# Altium schematic symbol library jlcpcb_2025_04_capacitors_extended_0805.schlib: 3281 symbols (part 13 of 18) (continued)
## FM21N681J251ECG
designator C?  Capacitance: 680pF  (hidden comment: *)
Capacitor, Ceramic (MLCC), 680pF, ±5%, 250V, C0G, ±5%, SMD 0805; Manufacturer: PSA(Prosperity Dielectrics); Manufacturer Part Number: FM21N681J251ECG; Package Size: 0805; JLCPCB Basic Part: No; JLCPCB Part Number: C2915701; Supplier 1: LCSC; Category: Capacitors - MLCC; Supplier Part Number 1: C2915701; Tolerance: ±5%; Voltage Rating: 250V; Temperature Coefficient: C0G; RoHS: Yes; ComponentLink1Description: Datasheet; ComponentLink1URL: https://wmsc.lcsc.com/wmsc/upload/file/pdf/v2/lcsc/2111172030_PSA-Prosperity-Dielectrics-FM21N681J251ECG_C2915701.pdf; ComponentLink2Description: JLCPCB Part URL; ComponentLink2URL: https://jlcpcb.com/partdetail/C2915701; ComponentLink3Description: LCSC Part URL; ComponentLink3URL: https://lcsc.com/product-detail/Multilayer-Ceramic-Capacitors-MLCC---SMD-SMT_PSAProsperity-Dielectrics-PSAProsperity-Dielectrics-FM21N681J251ECG_C2915701.html
footprint CAP-0805 (0805 (2012M) Capacitor)
pins: 1, 2

## FM21X101K251PXG
designator C?  Capacitance: 100pF  (hidden comment: *)
Capacitor, Ceramic (MLCC), 100pF, 250V, X7R, SMD 0805; Manufacturer: PSA(Prosperity Dielectrics); Manufacturer Part Number: FM21X101K251PXG; Package Size: 0805; JLCPCB Basic Part: No; JLCPCB Part Number: C2929108; Supplier 1: LCSC; Category: Capacitors - MLCC; Supplier Part Number 1: C2929108; Voltage Rating: 250V; Temperature Coefficient: X7R; RoHS: Yes; ComponentLink1Description: Datasheet; ComponentLink1URL: https://wmsc.lcsc.com/wmsc/upload/file/pdf/v2/lcsc/2201121400_PSA-Prosperity-Dielectrics-FM21X101K251PXG_C2929108.pdf; ComponentLink2Description: JLCPCB Part URL; ComponentLink2URL: https://jlcpcb.com/partdetail/C2929108; ComponentLink3Description: LCSC Part URL; ComponentLink3URL: https://lcsc.com/product-detail/Multilayer-Ceramic-Capacitors-MLCC---SMD-SMT_PSAProsperity-Dielectrics-PSAProsperity-Dielectrics-FM21X101K251PXG_C2929108.html
footprint CAP-0805 (0805 (2012M) Capacitor)
pins: 1, 2

## FM21X102K201PXG
designator C?  Capacitance: 1nF  (hidden comment: *)
Capacitor, Ceramic (MLCC), 1nF, ±10%, 200V, X7R, ±10%, SMD 0805; Manufacturer: PSA(Prosperity Dielectrics); Manufacturer Part Number: FM21X102K201PXG; Package Size: 0805; JLCPCB Basic Part: No; JLCPCB Part Number: C525179; Supplier 1: LCSC; Category: Capacitors - MLCC; Supplier Part Number 1: C525179; Tolerance: ±10%; Voltage Rating: 200V; Temperature Coefficient: X7R; RoHS: Yes; ComponentLink1Description: Datasheet; ComponentLink1URL: https://wmsc.lcsc.com/wmsc/upload/file/pdf/v2/lcsc/2304140030_PSA-Prosperity-Dielectrics-FM21X102K201PXG_C525179.pdf; ComponentLink2Description: JLCPCB Part URL; ComponentLink2URL: https://jlcpcb.com/partdetail/C525179; ComponentLink3Description: LCSC Part URL; ComponentLink3URL: https://lcsc.com/product-detail/Multilayer-Ceramic-Capacitors-MLCC---SMD-SMT_PSAProsperity-Dielectrics-PSAProsperity-Dielectrics-FM21X102K201PXG_C525179.html
footprint CAP-0805 (0805 (2012M) Capacitor)
pins: 1, 2

## FM21X102K501PXG
designator C?  Capacitance: 1nF  (hidden comment: *)
Capacitor, Ceramic (MLCC), 1nF, ±10%, 500V, X7R, ±10%, SMD 0805; Manufacturer: PSA(Prosperity Dielectrics); Manufacturer Part Number: FM21X102K501PXG; Package Size: 0805; JLCPCB Basic Part: No; JLCPCB Part Number: C440004; Supplier 1: LCSC; Category: Capacitors - MLCC; Supplier Part Number 1: C440004; Tolerance: ±10%; Voltage Rating: 500V; Temperature Coefficient: X7R; RoHS: Yes; ComponentLink1Description: Datasheet; ComponentLink1URL: https://wmsc.lcsc.com/wmsc/upload/file/pdf/v2/lcsc/2304140030_PSA-Prosperity-Dielectrics-FM21X102K501PXG_C440004.pdf; ComponentLink2Description: JLCPCB Part URL; ComponentLink2URL: https://jlcpcb.com/partdetail/C440004; ComponentLink3Description: LCSC Part URL; ComponentLink3URL: https://lcsc.com/product-detail/Multilayer-Ceramic-Capacitors-MLCC---SMD-SMT_PSAProsperity-Dielectrics-PSAProsperity-Dielectrics-FM21X102K501PXG_C440004.html
footprint CAP-0805 (0805 (2012M) Capacitor)
pins: 1, 2

## FM21X102K631PXG
designator C?  Capacitance: 1nF  (hidden comment: *)
Capacitor, Ceramic (MLCC), 1nF, ±10%, 630V, X7R, ±10%, SMD 0805; Manufacturer: PSA(Prosperity Dielectrics); Manufacturer Part Number: FM21X102K631PXG; Package Size: 0805; JLCPCB Basic Part: No; JLCPCB Part Number: C436243; Supplier 1: LCSC; Category: Capacitors - MLCC; Supplier Part Number 1: C436243; Tolerance: ±10%; Voltage Rating: 630V; Temperature Coefficient: X7R; RoHS: Yes; ComponentLink1Description: Datasheet; ComponentLink1URL: https://wmsc.lcsc.com/wmsc/upload/file/pdf/v2/lcsc/2304140030_PSA-Prosperity-Dielectrics-FM21X102K631PXG_C436243.pdf; ComponentLink2Description: JLCPCB Part URL; ComponentLink2URL: https://jlcpcb.com/partdetail/C436243; ComponentLink3Description: LCSC Part URL; ComponentLink3URL: https://lcsc.com/product-detail/Multilayer-Ceramic-Capacitors-MLCC---SMD-SMT_PSAProsperity-Dielectrics-PSAProsperity-Dielectrics-FM21X102K631PXG_C436243.html
footprint CAP-0805 (0805 (2012M) Capacitor)
pins: 1, 2

## FM21X103K101PXG
designator C?  Capacitance: 10nF  (hidden comment: *)
Capacitor, Ceramic (MLCC), 10nF, ±10%, 100V, X7R, ±10%, SMD 0805; Manufacturer: PSA(Prosperity Dielectrics); Manufacturer Part Number: FM21X103K101PXG; Package Size: 0805; JLCPCB Basic Part: No; JLCPCB Part Number: C525180; Supplier 1: LCSC; Category: Capacitors - MLCC; Supplier Part Number 1: C525180; Tolerance: ±10%; Voltage Rating: 100V; Temperature Coefficient: X7R; RoHS: Yes; ComponentLink1Description: Datasheet; ComponentLink1URL: https://wmsc.lcsc.com/wmsc/upload/file/pdf/v2/lcsc/2304140030_PSA-Prosperity-Dielectrics-FM21X103K101PXG_C525180.pdf; ComponentLink2Description: JLCPCB Part URL; ComponentLink2URL: https://jlcpcb.com/partdetail/C525180; ComponentLink3Description: LCSC Part URL; ComponentLink3URL: https://lcsc.com/product-detail/Multilayer-Ceramic-Capacitors-MLCC---SMD-SMT_PSAProsperity-Dielectrics-PSAProsperity-Dielectrics-FM21X103K101PXG_C525180.html
footprint CAP-0805 (0805 (2012M) Capacitor)
pins: 1, 2

## FM21X103K201ECG
designator C?  Capacitance: 10nF  (hidden comment: *)
Capacitor, Ceramic (MLCC), 10nF, ±10%, 200V, X7R, ±10%, SMD 0805; Manufacturer: PSA(Prosperity Dielectrics); Manufacturer Part Number: FM21X103K201ECG; Package Size: 0805; JLCPCB Basic Part: No; JLCPCB Part Number: C382245; Supplier 1: LCSC; Category: Capacitors - MLCC; Supplier Part Number 1: C382245; Tolerance: ±10%; Voltage Rating: 200V; Temperature Coefficient: X7R; RoHS: Yes; ComponentLink1Description: Datasheet; ComponentLink1URL: https://wmsc.lcsc.com/wmsc/upload/file/pdf/v2/lcsc/2304140030_PSA-Prosperity-Dielectrics-FM21X103K201ECG_C382245.pdf; ComponentLink2Description: JLCPCB Part URL; ComponentLink2URL: https://jlcpcb.com/partdetail/C382245; ComponentLink3Description: LCSC Part URL; ComponentLink3URL: https://lcsc.com/product-detail/Multilayer-Ceramic-Capacitors-MLCC---SMD-SMT_PSAProsperity-Dielectrics-PSAProsperity-Dielectrics-FM21X103K201ECG_C382245.html
footprint CAP-0805 (0805 (2012M) Capacitor)
pins: 1, 2

## FM21X103K251ECG
designator C?  Capacitance: 10nF  (hidden comment: *)
Capacitor, Ceramic (MLCC), 10nF, ±10%, 250V, X7R, ±10%, SMD 0805; Manufacturer: PSA(Prosperity Dielectrics); Manufacturer Part Number: FM21X103K251ECG; Package Size: 0805; JLCPCB Basic Part: No; JLCPCB Part Number: C394155; Supplier 1: LCSC; Category: Capacitors - MLCC; Supplier Part Number 1: C394155; Tolerance: ±10%; Voltage Rating: 250V; Temperature Coefficient: X7R; RoHS: Yes; ComponentLink1Description: Datasheet; ComponentLink1URL: https://wmsc.lcsc.com/wmsc/upload/file/pdf/v2/lcsc/2304140030_PSA-Prosperity-Dielectrics-FM21X103K251ECG_C394155.pdf; ComponentLink2Description: JLCPCB Part URL; ComponentLink2URL: https://jlcpcb.com/partdetail/C394155; ComponentLink3Description: LCSC Part URL; ComponentLink3URL: https://lcsc.com/product-detail/Multilayer-Ceramic-Capacitors-MLCC---SMD-SMT_PSAProsperity-Dielectrics-PSAProsperity-Dielectrics-FM21X103K251ECG_C394155.html
footprint CAP-0805 (0805 (2012M) Capacitor)
pins: 1, 2

## FM21X103K251PXG
designator C?  Capacitance: 10nF  (hidden comment: *)
Capacitor, Ceramic (MLCC), 10nF, ±10%, 250V, X7R, ±10%, SMD 0805; Manufacturer: PSA(Prosperity Dielectrics); Manufacturer Part Number: FM21X103K251PXG; Package Size: 0805; JLCPCB Basic Part: No; JLCPCB Part Number: C382244; Supplier 1: LCSC; Category: Capacitors - MLCC; Supplier Part Number 1: C382244; Tolerance: ±10%; Voltage Rating: 250V; Temperature Coefficient: X7R; RoHS: Yes; ComponentLink1Description: Datasheet; ComponentLink1URL: https://wmsc.lcsc.com/wmsc/upload/file/pdf/v2/lcsc/2304140030_PSA-Prosperity-Dielectrics-FM21X103K251PXG_C382244.pdf; ComponentLink2Description: JLCPCB Part URL; ComponentLink2URL: https://jlcpcb.com/partdetail/C382244; ComponentLink3Description: LCSC Part URL; ComponentLink3URL: https://lcsc.com/product-detail/Multilayer-Ceramic-Capacitors-MLCC---SMD-SMT_PSAProsperity-Dielectrics-PSAProsperity-Dielectrics-FM21X103K251PXG_C382244.html
footprint CAP-0805 (0805 (2012M) Capacitor)
pins: 1, 2

## FM21X103K501ECG
designator C?  Capacitance: 10nF  (hidden comment: *)
Capacitor, Ceramic (MLCC), 10nF, ±10%, 500V, X7R, ±10%, SMD 0805; Manufacturer: PSA(Prosperity Dielectrics); Manufacturer Part Number: FM21X103K501ECG; Package Size: 0805; JLCPCB Basic Part: No; JLCPCB Part Number: C382243; Supplier 1: LCSC; Category: Capacitors - MLCC; Supplier Part Number 1: C382243; Tolerance: ±10%; Voltage Rating: 500V; Temperature Coefficient: X7R; RoHS: Yes; ComponentLink1Description: Datasheet; ComponentLink1URL: https://wmsc.lcsc.com/wmsc/upload/file/pdf/v2/lcsc/2304140030_PSA-Prosperity-Dielectrics-FM21X103K501ECG_C382243.pdf; ComponentLink2Description: JLCPCB Part URL; ComponentLink2URL: https://jlcpcb.com/partdetail/C382243; ComponentLink3Description: LCSC Part URL; ComponentLink3URL: https://lcsc.com/product-detail/Multilayer-Ceramic-Capacitors-MLCC---SMD-SMT_PSAProsperity-Dielectrics-PSAProsperity-Dielectrics-FM21X103K501ECG_C382243.html
footprint CAP-0805 (0805 (2012M) Capacitor)
pins: 1, 2

## FM21X104J101ECG
designator C?  Capacitance: 100nF  (hidden comment: *)
Capacitor, Ceramic (MLCC), 100nF, ±5%, 100V, X7R, ±5%, SMD 0805; Manufacturer: PSA(Prosperity Dielectrics); Manufacturer Part Number: FM21X104J101ECG; Package Size: 0805; JLCPCB Basic Part: No; JLCPCB Part Number: C2874759; Supplier 1: LCSC; Category: Capacitors - MLCC; Supplier Part Number 1: C2874759; Tolerance: ±5%; Voltage Rating: 100V; Temperature Coefficient: X7R; RoHS: Yes; ComponentLink1Description: Datasheet; ComponentLink1URL: https://wmsc.lcsc.com/wmsc/upload/file/pdf/v2/lcsc/2108150330_PSA-Prosperity-Dielectrics-FM21X104J101ECG_C2874759.pdf; ComponentLink2Description: JLCPCB Part URL; ComponentLink2URL: https://jlcpcb.com/partdetail/C2874759; ComponentLink3Description: LCSC Part URL; ComponentLink3URL: https://lcsc.com/product-detail/Multilayer-Ceramic-Capacitors-MLCC---SMD-SMT_PSAProsperity-Dielectrics-PSAProsperity-Dielectrics-FM21X104J101ECG_C2874759.html
footprint CAP-0805 (0805 (2012M) Capacitor)
pins: 1, 2

## FM21X104K101ECG
designator C?  Capacitance: 100nF  (hidden comment: *)
Capacitor, Ceramic (MLCC), 100nF, ±10%, 100V, X7R, ±10%, SMD 0805; Manufacturer: PSA(Prosperity Dielectrics); Manufacturer Part Number: FM21X104K101ECG; Package Size: 0805; JLCPCB Basic Part: No; JLCPCB Part Number: C148241; Supplier 1: LCSC; Category: Capacitors - MLCC; Supplier Part Number 1: C148241; Tolerance: ±10%; Voltage Rating: 100V; Temperature Coefficient: X7R; RoHS: Yes; ComponentLink1Description: Datasheet; ComponentLink1URL: https://wmsc.lcsc.com/wmsc/upload/file/pdf/v2/lcsc/1811101032_PSA-Prosperity-Dielectrics-FM21X104K101ECG_C148241.pdf; ComponentLink2Description: JLCPCB Part URL; ComponentLink2URL: https://jlcpcb.com/partdetail/C148241; ComponentLink3Description: LCSC Part URL; ComponentLink3URL: https://lcsc.com/product-detail/Multilayer-Ceramic-Capacitors-MLCC---SMD-SMT_PSAProsperity-Dielectrics-PSAProsperity-Dielectrics-FM21X104K101ECG_C148241.html
footprint CAP-0805 (0805 (2012M) Capacitor)
pins: 1, 2

## FM21X104K201ECG
designator C?  Capacitance: 100nF  (hidden comment: *)
Capacitor, Ceramic (MLCC), 100nF, ±10%, 200V, X7R, ±10%, SMD 0805; Manufacturer: PSA(Prosperity Dielectrics); Manufacturer Part Number: FM21X104K201ECG; Package Size: 0805; JLCPCB Basic Part: No; JLCPCB Part Number: C784084; Supplier 1: LCSC; Category: Capacitors - MLCC; Supplier Part Number 1: C784084; Tolerance: ±10%; Voltage Rating: 200V; Temperature Coefficient: X7R; RoHS: Yes; ComponentLink1Description: Datasheet; ComponentLink1URL: https://wmsc.lcsc.com/wmsc/upload/file/pdf/v2/lcsc/2304140030_PSA-Prosperity-Dielectrics-FM21X104K201ECG_C784084.pdf; ComponentLink2Description: JLCPCB Part URL; ComponentLink2URL: https://jlcpcb.com/partdetail/C784084; ComponentLink3Description: LCSC Part URL; ComponentLink3URL: https://lcsc.com/product-detail/Multilayer-Ceramic-Capacitors-MLCC---SMD-SMT_PSAProsperity-Dielectrics-PSAProsperity-Dielectrics-FM21X104K201ECG_C784084.html
footprint CAP-0805 (0805 (2012M) Capacitor)
pins: 1, 2

## FM21X122K101PXG
designator C?  Capacitance: 1.2nF  (hidden comment: *)
Capacitor, Ceramic (MLCC), 1.2nF, ±10%, 100V, X7R, ±10%, SMD 0805; Manufacturer: PSA(Prosperity Dielectrics); Manufacturer Part Number: FM21X122K101PXG; Package Size: 0805; JLCPCB Basic Part: No; JLCPCB Part Number: C565631; Supplier 1: LCSC; Category: Capacitors - MLCC; Supplier Part Number 1: C565631; Tolerance: ±10%; Voltage Rating: 100V; Temperature Coefficient: X7R; RoHS: Yes; ComponentLink1Description: Datasheet; ComponentLink1URL: https://wmsc.lcsc.com/wmsc/upload/file/pdf/v2/lcsc/2304140030_PSA-Prosperity-Dielectrics-FM21X122K101PXG_C565631.pdf; ComponentLink2Description: JLCPCB Part URL; ComponentLink2URL: https://jlcpcb.com/partdetail/C565631; ComponentLink3Description: LCSC Part URL; ComponentLink3URL: https://lcsc.com/product-detail/Multilayer-Ceramic-Capacitors-MLCC---SMD-SMT_PSAProsperity-Dielectrics-PSAProsperity-Dielectrics-FM21X122K101PXG_C565631.html
footprint CAP-0805 (0805 (2012M) Capacitor)
pins: 1, 2

## FM21X122K251PXG
designator C?  Capacitance: 1.2nF  (hidden comment: *)
Capacitor, Ceramic (MLCC), 1.2nF, ±10%, 250V, ±10%, SMD 0805; Manufacturer: PSA(Prosperity Dielectrics); Manufacturer Part Number: FM21X122K251PXG; Package Size: 0805; JLCPCB Basic Part: No; JLCPCB Part Number: C565652; Supplier 1: LCSC; Category: Capacitors - MLCC; Supplier Part Number 1: C565652; Tolerance: ±10%; Voltage Rating: 250V; RoHS: Yes; ComponentLink1Description: Datasheet; ComponentLink1URL: https://wmsc.lcsc.com/wmsc/upload/file/pdf/v2/lcsc/2304140030_PSA-Prosperity-Dielectrics-FM21X122K251PXG_C565652.pdf; ComponentLink2Description: JLCPCB Part URL; ComponentLink2URL: https://jlcpcb.com/partdetail/C565652; ComponentLink3Description: LCSC Part URL; ComponentLink3URL: https://lcsc.com/product-detail/Multilayer-Ceramic-Capacitors-MLCC---SMD-SMT_PSAProsperity-Dielectrics-PSAProsperity-Dielectrics-FM21X122K251PXG_C565652.html
footprint CAP-0805 (0805 (2012M) Capacitor)
pins: 1, 2

## FM21X152K101PXG
designator C?  Capacitance: 1.5nF  (hidden comment: *)
Capacitor, Ceramic (MLCC), 1.5nF, ±10%, 100V, X7R, ±10%, SMD 0805; Manufacturer: PSA(Prosperity Dielectrics); Manufacturer Part Number: FM21X152K101PXG; Package Size: 0805; JLCPCB Basic Part: No; JLCPCB Part Number: C565632; Supplier 1: LCSC; Category: Capacitors - MLCC; Supplier Part Number 1: C565632; Tolerance: ±10%; Voltage Rating: 100V; Temperature Coefficient: X7R; RoHS: Yes; ComponentLink1Description: Datasheet; ComponentLink1URL: https://wmsc.lcsc.com/wmsc/upload/file/pdf/v2/lcsc/2304140030_PSA-Prosperity-Dielectrics-FM21X152K101PXG_C565632.pdf; ComponentLink2Description: JLCPCB Part URL; ComponentLink2URL: https://jlcpcb.com/partdetail/C565632; ComponentLink3Description: LCSC Part URL; ComponentLink3URL: https://lcsc.com/product-detail/Multilayer-Ceramic-Capacitors-MLCC---SMD-SMT_PSAProsperity-Dielectrics-PSAProsperity-Dielectrics-FM21X152K101PXG_C565632.html
footprint CAP-0805 (0805 (2012M) Capacitor)
pins: 1, 2

## FM21X152K251PXG
designator C?  Capacitance: 1.5nF  (hidden comment: *)
Capacitor, Ceramic (MLCC), 1.5nF, ±10%, 250V, X7R, ±10%, SMD 0805; Manufacturer: PSA(Prosperity Dielectrics); Manufacturer Part Number: FM21X152K251PXG; Package Size: 0805; JLCPCB Basic Part: No; JLCPCB Part Number: C565653; Supplier 1: LCSC; Category: Capacitors - MLCC; Supplier Part Number 1: C565653; Tolerance: ±10%; Voltage Rating: 250V; Temperature Coefficient: X7R; RoHS: Yes; ComponentLink1Description: Datasheet; ComponentLink1URL: https://wmsc.lcsc.com/wmsc/upload/file/pdf/v2/lcsc/2304140030_PSA-Prosperity-Dielectrics-FM21X152K251PXG_C565653.pdf; ComponentLink2Description: JLCPCB Part URL; ComponentLink2URL: https://jlcpcb.com/partdetail/C565653; ComponentLink3Description: LCSC Part URL; ComponentLink3URL: https://lcsc.com/product-detail/Multilayer-Ceramic-Capacitors-MLCC---SMD-SMT_PSAProsperity-Dielectrics-PSAProsperity-Dielectrics-FM21X152K251PXG_C565653.html
footprint CAP-0805 (0805 (2012M) Capacitor)
pins: 1, 2

## FM21X182K251PXG
designator C?  Capacitance: 1.8nF  (hidden comment: *)
Capacitor, Ceramic (MLCC), 1.8nF, ±10%, 250V, ±10%, SMD 0805; Manufacturer: PSA(Prosperity Dielectrics); Manufacturer Part Number: FM21X182K251PXG; Package Size: 0805; JLCPCB Basic Part: No; JLCPCB Part Number: C565654; Supplier 1: LCSC; Category: Capacitors - MLCC; Supplier Part Number 1: C565654; Tolerance: ±10%; Voltage Rating: 250V; RoHS: Yes; ComponentLink1Description: Datasheet; ComponentLink1URL: https://wmsc.lcsc.com/wmsc/upload/file/pdf/v2/lcsc/2304140030_PSA-Prosperity-Dielectrics-FM21X182K251PXG_C565654.pdf; ComponentLink2Description: JLCPCB Part URL; ComponentLink2URL: https://jlcpcb.com/partdetail/C565654; ComponentLink3Description: LCSC Part URL; ComponentLink3URL: https://lcsc.com/product-detail/Multilayer-Ceramic-Capacitors-MLCC---SMD-SMT_PSAProsperity-Dielectrics-PSAProsperity-Dielectrics-FM21X182K251PXG_C565654.html
footprint CAP-0805 (0805 (2012M) Capacitor)
pins: 1, 2

## FM21X221K501PXG
designator C?  Capacitance: 220pF  (hidden comment: *)
Capacitor, Ceramic (MLCC), 220pF, ±10%, 500V, X7R, ±10%, SMD 0805; Manufacturer: PSA(Prosperity Dielectrics); Manufacturer Part Number: FM21X221K501PXG; Package Size: 0805; JLCPCB Basic Part: No; JLCPCB Part Number: C464970; Supplier 1: LCSC; Category: Capacitors - MLCC; Supplier Part Number 1: C464970; Tolerance: ±10%; Voltage Rating: 500V; Temperature Coefficient: X7R; RoHS: Yes; ComponentLink1Description: Datasheet; ComponentLink1URL: https://wmsc.lcsc.com/wmsc/upload/file/pdf/v2/lcsc/2304140030_PSA-Prosperity-Dielectrics-FM21X221K501PXG_C464970.pdf; ComponentLink2Description: JLCPCB Part URL; ComponentLink2URL: https://jlcpcb.com/partdetail/C464970; ComponentLink3Description: LCSC Part URL; ComponentLink3URL: https://lcsc.com/product-detail/Multilayer-Ceramic-Capacitors-MLCC---SMD-SMT_PSAProsperity-Dielectrics-PSAProsperity-Dielectrics-FM21X221K501PXG_C464970.html
footprint CAP-0805 (0805 (2012M) Capacitor)
pins: 1, 2

## FM21X222K101PXG
designator C?  Capacitance: 2.2nF  (hidden comment: *)
Capacitor, Ceramic (MLCC), 2.2nF, ±10%, 100V, X7R, ±10%, SMD 0805; Manufacturer: PSA(Prosperity Dielectrics); Manufacturer Part Number: FM21X222K101PXG; Package Size: 0805; JLCPCB Basic Part: No; JLCPCB Part Number: C525181; Supplier 1: LCSC; Category: Capacitors - MLCC; Supplier Part Number 1: C525181; Tolerance: ±10%; Voltage Rating: 100V; Temperature Coefficient: X7R; RoHS: Yes; ComponentLink1Description: Datasheet; ComponentLink1URL: https://wmsc.lcsc.com/wmsc/upload/file/pdf/v2/lcsc/2304140030_PSA-Prosperity-Dielectrics-FM21X222K101PXG_C525181.pdf; ComponentLink2Description: JLCPCB Part URL; ComponentLink2URL: https://jlcpcb.com/partdetail/C525181; ComponentLink3Description: LCSC Part URL; ComponentLink3URL: https://lcsc.com/product-detail/Multilayer-Ceramic-Capacitors-MLCC---SMD-SMT_PSAProsperity-Dielectrics-PSAProsperity-Dielectrics-FM21X222K101PXG_C525181.html
footprint CAP-0805 (0805 (2012M) Capacitor)
pins: 1, 2

## FM21X222K251PXG
designator C?  Capacitance: 2.2nF  (hidden comment: *)
Capacitor, Ceramic (MLCC), 2.2nF, ±10%, 250V, X7R, ±10%, SMD 0805; Manufacturer: PSA(Prosperity Dielectrics); Manufacturer Part Number: FM21X222K251PXG; Package Size: 0805; JLCPCB Basic Part: No; JLCPCB Part Number: C525182; Supplier 1: LCSC; Category: Capacitors - MLCC; Supplier Part Number 1: C525182; Tolerance: ±10%; Voltage Rating: 250V; Temperature Coefficient: X7R; RoHS: Yes; ComponentLink1Description: Datasheet; ComponentLink1URL: https://wmsc.lcsc.com/wmsc/upload/file/pdf/v2/lcsc/2304140030_PSA-Prosperity-Dielectrics-FM21X222K251PXG_C525182.pdf; ComponentLink2Description: JLCPCB Part URL; ComponentLink2URL: https://jlcpcb.com/partdetail/C525182; ComponentLink3Description: LCSC Part URL; ComponentLink3URL: https://lcsc.com/product-detail/Multilayer-Ceramic-Capacitors-MLCC---SMD-SMT_PSAProsperity-Dielectrics-PSAProsperity-Dielectrics-FM21X222K251PXG_C525182.html
footprint CAP-0805 (0805 (2012M) Capacitor)
pins: 1, 2

## FM21X223K201ECG
designator C?  Capacitance: 22nF  (hidden comment: *)
Capacitor, Ceramic (MLCC), 22nF, ±10%, 200V, X7R, ±10%, SMD 0805; Manufacturer: PSA(Prosperity Dielectrics); Manufacturer Part Number: FM21X223K201ECG; Package Size: 0805; JLCPCB Basic Part: No; JLCPCB Part Number: C382242; Supplier 1: LCSC; Category: Capacitors - MLCC; Supplier Part Number 1: C382242; Tolerance: ±10%; Voltage Rating: 200V; Temperature Coefficient: X7R; RoHS: Yes; ComponentLink1Description: Datasheet; ComponentLink1URL: https://wmsc.lcsc.com/wmsc/upload/file/pdf/v2/lcsc/2304140030_PSA-Prosperity-Dielectrics-FM21X223K201ECG_C382242.pdf; ComponentLink2Description: JLCPCB Part URL; ComponentLink2URL: https://jlcpcb.com/partdetail/C382242; ComponentLink3Description: LCSC Part URL; ComponentLink3URL: https://lcsc.com/product-detail/Multilayer-Ceramic-Capacitors-MLCC---SMD-SMT_PSAProsperity-Dielectrics-PSAProsperity-Dielectrics-FM21X223K201ECG_C382242.html
footprint CAP-0805 (0805 (2012M) Capacitor)
pins: 1, 2

## FM21X223K251ECG
designator C?  Capacitance: 22nF  (hidden comment: *)
Capacitor, Ceramic (MLCC), 22nF, ±10%, 250V, X7R, ±10%, SMD 0805; Manufacturer: PSA(Prosperity Dielectrics); Manufacturer Part Number: FM21X223K251ECG; Package Size: 0805; JLCPCB Basic Part: No; JLCPCB Part Number: C784085; Supplier 1: LCSC; Category: Capacitors - MLCC; Supplier Part Number 1: C784085; Tolerance: ±10%; Voltage Rating: 250V; Temperature Coefficient: X7R; RoHS: Yes; ComponentLink1Description: Datasheet; ComponentLink1URL: https://wmsc.lcsc.com/wmsc/upload/file/pdf/v2/lcsc/2304140030_PSA-Prosperity-Dielectrics-FM21X223K251ECG_C784085.pdf; ComponentLink2Description: JLCPCB Part URL; ComponentLink2URL: https://jlcpcb.com/partdetail/C784085; ComponentLink3Description: LCSC Part URL; ComponentLink3URL: https://lcsc.com/product-detail/Multilayer-Ceramic-Capacitors-MLCC---SMD-SMT_PSAProsperity-Dielectrics-PSAProsperity-Dielectrics-FM21X223K251ECG_C784085.html
footprint CAP-0805 (0805 (2012M) Capacitor)
pins: 1, 2

## FM21X223K251PXG
designator C?  Capacitance: 22nF  (hidden comment: *)
Capacitor, Ceramic (MLCC), 22nF, ±10%, 250V, ±10%, SMD 0805; Manufacturer: PSA(Prosperity Dielectrics); Manufacturer Part Number: FM21X223K251PXG; Package Size: 0805; JLCPCB Basic Part: No; JLCPCB Part Number: C1021628; Supplier 1: LCSC; Category: Capacitors - MLCC; Supplier Part Number 1: C1021628; Tolerance: ±10%; Voltage Rating: 250V; RoHS: Yes; ComponentLink1Description: Datasheet; ComponentLink1URL: https://wmsc.lcsc.com/wmsc/upload/file/pdf/v2/lcsc/2012231313_PSA-Prosperity-Dielectrics-FM21X223K251PXG_C1021628.pdf; ComponentLink2Description: JLCPCB Part URL; ComponentLink2URL: https://jlcpcb.com/partdetail/C1021628; ComponentLink3Description: LCSC Part URL; ComponentLink3URL: https://lcsc.com/product-detail/Multilayer-Ceramic-Capacitors-MLCC---SMD-SMT_PSAProsperity-Dielectrics-PSAProsperity-Dielectrics-FM21X223K251PXG_C1021628.html
footprint CAP-0805 (0805 (2012M) Capacitor)
pins: 1, 2

## FM21X224K101ECG
designator C?  Capacitance: 220nF  (hidden comment: *)
Capacitor, Ceramic (MLCC), 220nF, ±10%, 100V, X7R, ±10%, SMD 0805; Manufacturer: PSA(Prosperity Dielectrics); Manufacturer Part Number: FM21X224K101ECG; Package Size: 0805; JLCPCB Basic Part: No; JLCPCB Part Number: C382241; Supplier 1: LCSC; Category: Capacitors - MLCC; Supplier Part Number 1: C382241; Tolerance: ±10%; Voltage Rating: 100V; Temperature Coefficient: X7R; RoHS: Yes; ComponentLink1Description: Datasheet; ComponentLink1URL: https://wmsc.lcsc.com/wmsc/upload/file/pdf/v2/lcsc/2304140030_PSA-Prosperity-Dielectrics-FM21X224K101ECG_C382241.pdf; ComponentLink2Description: JLCPCB Part URL; ComponentLink2URL: https://jlcpcb.com/partdetail/C382241; ComponentLink3Description: LCSC Part URL; ComponentLink3URL: https://lcsc.com/product-detail/Multilayer-Ceramic-Capacitors-MLCC---SMD-SMT_PSAProsperity-Dielectrics-PSAProsperity-Dielectrics-FM21X224K101ECG_C382241.html
footprint CAP-0805 (0805 (2012M) Capacitor)
pins: 1, 2

## FM21X272K101PXG
designator C?  Capacitance: 2.7nF  (hidden comment: *)
Capacitor, Ceramic (MLCC), 2.7nF, ±10%, 100V, X7R, ±10%, SMD 0805; Manufacturer: PSA(Prosperity Dielectrics); Manufacturer Part Number: FM21X272K101PXG; Package Size: 0805; JLCPCB Basic Part: No; JLCPCB Part Number: C382240; Supplier 1: LCSC; Category: Capacitors - MLCC; Supplier Part Number 1: C382240; Tolerance: ±10%; Voltage Rating: 100V; Temperature Coefficient: X7R; RoHS: Yes; ComponentLink1Description: Datasheet; ComponentLink1URL: https://wmsc.lcsc.com/wmsc/upload/file/pdf/v2/lcsc/2304140030_PSA-Prosperity-Dielectrics-FM21X272K101PXG_C382240.pdf; ComponentLink2Description: JLCPCB Part URL; ComponentLink2URL: https://jlcpcb.com/partdetail/C382240; ComponentLink3Description: LCSC Part URL; ComponentLink3URL: https://lcsc.com/product-detail/Multilayer-Ceramic-Capacitors-MLCC---SMD-SMT_PSAProsperity-Dielectrics-PSAProsperity-Dielectrics-FM21X272K101PXG_C382240.html
footprint CAP-0805 (0805 (2012M) Capacitor)
pins: 1, 2

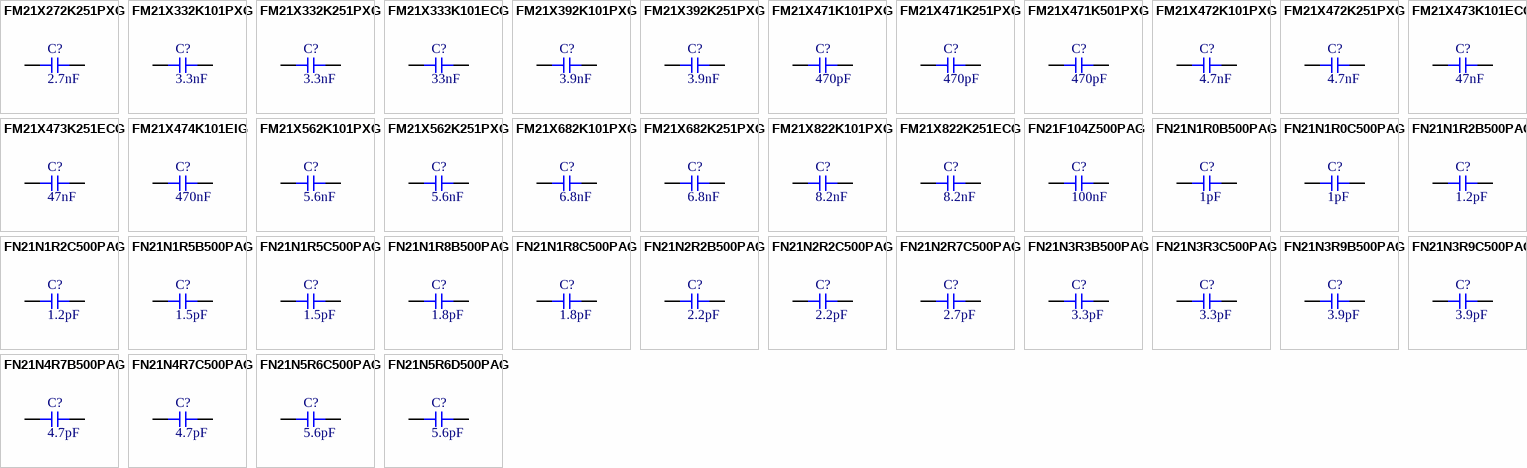
[diagram p57: symbols FM21X272K251PXG to FN21N5R6D500PAG]

## FM21X272K251PXG
designator C?  Capacitance: 2.7nF  (hidden comment: *)
Capacitor, Ceramic (MLCC), 2.7nF, ±10%, 250V, X7R, ±10%, SMD 0805; Manufacturer: PSA(Prosperity Dielectrics); Manufacturer Part Number: FM21X272K251PXG; Package Size: 0805; JLCPCB Basic Part: No; JLCPCB Part Number: C565655; Supplier 1: LCSC; Category: Capacitors - MLCC; Supplier Part Number 1: C565655; Tolerance: ±10%; Voltage Rating: 250V; Temperature Coefficient: X7R; RoHS: Yes; ComponentLink1Description: Datasheet; ComponentLink1URL: https://wmsc.lcsc.com/wmsc/upload/file/pdf/v2/lcsc/2304140030_PSA-Prosperity-Dielectrics-FM21X272K251PXG_C565655.pdf; ComponentLink2Description: JLCPCB Part URL; ComponentLink2URL: https://jlcpcb.com/partdetail/C565655; ComponentLink3Description: LCSC Part URL; ComponentLink3URL: https://lcsc.com/product-detail/Multilayer-Ceramic-Capacitors-MLCC---SMD-SMT_PSAProsperity-Dielectrics-PSAProsperity-Dielectrics-FM21X272K251PXG_C565655.html
footprint CAP-0805 (0805 (2012M) Capacitor)
pins: 1, 2

## FM21X332K101PXG
designator C?  Capacitance: 3.3nF  (hidden comment: *)
Capacitor, Ceramic (MLCC), 3.3nF, ±10%, 100V, X7R, ±10%, SMD 0805; Manufacturer: PSA(Prosperity Dielectrics); Manufacturer Part Number: FM21X332K101PXG; Package Size: 0805; JLCPCB Basic Part: No; JLCPCB Part Number: C565634; Supplier 1: LCSC; Category: Capacitors - MLCC; Supplier Part Number 1: C565634; Tolerance: ±10%; Voltage Rating: 100V; Temperature Coefficient: X7R; RoHS: Yes; ComponentLink1Description: Datasheet; ComponentLink1URL: https://wmsc.lcsc.com/wmsc/upload/file/pdf/v2/lcsc/2304140030_PSA-Prosperity-Dielectrics-FM21X332K101PXG_C565634.pdf; ComponentLink2Description: JLCPCB Part URL; ComponentLink2URL: https://jlcpcb.com/partdetail/C565634; ComponentLink3Description: LCSC Part URL; ComponentLink3URL: https://lcsc.com/product-detail/Multilayer-Ceramic-Capacitors-MLCC---SMD-SMT_PSAProsperity-Dielectrics-PSAProsperity-Dielectrics-FM21X332K101PXG_C565634.html
footprint CAP-0805 (0805 (2012M) Capacitor)
pins: 1, 2

## FM21X332K251PXG
designator C?  Capacitance: 3.3nF  (hidden comment: *)
Capacitor, Ceramic (MLCC), 3.3nF, ±10%, 250V, X7R, ±10%, SMD 0805; Manufacturer: PSA(Prosperity Dielectrics); Manufacturer Part Number: FM21X332K251PXG; Package Size: 0805; JLCPCB Basic Part: No; JLCPCB Part Number: C565656; Supplier 1: LCSC; Category: Capacitors - MLCC; Supplier Part Number 1: C565656; Tolerance: ±10%; Voltage Rating: 250V; Temperature Coefficient: X7R; RoHS: Yes; ComponentLink1Description: Datasheet; ComponentLink1URL: https://wmsc.lcsc.com/wmsc/upload/file/pdf/v2/lcsc/2304140030_PSA-Prosperity-Dielectrics-FM21X332K251PXG_C565656.pdf; ComponentLink2Description: JLCPCB Part URL; ComponentLink2URL: https://jlcpcb.com/partdetail/C565656; ComponentLink3Description: LCSC Part URL; ComponentLink3URL: https://lcsc.com/product-detail/Multilayer-Ceramic-Capacitors-MLCC---SMD-SMT_PSAProsperity-Dielectrics-PSAProsperity-Dielectrics-FM21X332K251PXG_C565656.html
footprint CAP-0805 (0805 (2012M) Capacitor)
pins: 1, 2

## FM21X333K101ECG
designator C?  Capacitance: 33nF  (hidden comment: *)
Capacitor, Ceramic (MLCC), 33nF, 100V, X7R, SMD 0805; Manufacturer: PSA(Prosperity Dielectrics); Manufacturer Part Number: FM21X333K101ECG; Package Size: 0805; JLCPCB Basic Part: No; JLCPCB Part Number: C2915707; Supplier 1: LCSC; Category: Capacitors - MLCC; Supplier Part Number 1: C2915707; Voltage Rating: 100V; Temperature Coefficient: X7R; RoHS: Yes; ComponentLink1Description: Datasheet; ComponentLink1URL: https://wmsc.lcsc.com/wmsc/upload/file/pdf/v2/lcsc/2111172030_PSA-Prosperity-Dielectrics-FM21X333K101ECG_C2915707.pdf; ComponentLink2Description: JLCPCB Part URL; ComponentLink2URL: https://jlcpcb.com/partdetail/C2915707; ComponentLink3Description: LCSC Part URL; ComponentLink3URL: https://lcsc.com/product-detail/Multilayer-Ceramic-Capacitors-MLCC---SMD-SMT_PSAProsperity-Dielectrics-PSAProsperity-Dielectrics-FM21X333K101ECG_C2915707.html
footprint CAP-0805 (0805 (2012M) Capacitor)
pins: 1, 2

## FM21X392K101PXG
designator C?  Capacitance: 3.9nF  (hidden comment: *)
Capacitor, Ceramic (MLCC), 3.9nF, ±10%, 100V, X7R, ±10%, SMD 0805; Manufacturer: PSA(Prosperity Dielectrics); Manufacturer Part Number: FM21X392K101PXG; Package Size: 0805; JLCPCB Basic Part: No; JLCPCB Part Number: C565635; Supplier 1: LCSC; Category: Capacitors - MLCC; Supplier Part Number 1: C565635; Tolerance: ±10%; Voltage Rating: 100V; Temperature Coefficient: X7R; RoHS: Yes; ComponentLink1Description: Datasheet; ComponentLink1URL: https://wmsc.lcsc.com/wmsc/upload/file/pdf/v2/lcsc/2304140030_PSA-Prosperity-Dielectrics-FM21X392K101PXG_C565635.pdf; ComponentLink2Description: JLCPCB Part URL; ComponentLink2URL: https://jlcpcb.com/partdetail/C565635; ComponentLink3Description: LCSC Part URL; ComponentLink3URL: https://lcsc.com/product-detail/Multilayer-Ceramic-Capacitors-MLCC---SMD-SMT_PSAProsperity-Dielectrics-PSAProsperity-Dielectrics-FM21X392K101PXG_C565635.html
footprint CAP-0805 (0805 (2012M) Capacitor)
pins: 1, 2

## FM21X392K251PXG
designator C?  Capacitance: 3.9nF  (hidden comment: *)
Capacitor, Ceramic (MLCC), 3.9nF, ±10%, 250V, X7R, ±10%, SMD 0805; Manufacturer: PSA(Prosperity Dielectrics); Manufacturer Part Number: FM21X392K251PXG; Package Size: 0805; JLCPCB Basic Part: No; JLCPCB Part Number: C565657; Supplier 1: LCSC; Category: Capacitors - MLCC; Supplier Part Number 1: C565657; Tolerance: ±10%; Voltage Rating: 250V; Temperature Coefficient: X7R; RoHS: Yes; ComponentLink1Description: Datasheet; ComponentLink1URL: https://wmsc.lcsc.com/wmsc/upload/file/pdf/v2/lcsc/2304140030_PSA-Prosperity-Dielectrics-FM21X392K251PXG_C565657.pdf; ComponentLink2Description: JLCPCB Part URL; ComponentLink2URL: https://jlcpcb.com/partdetail/C565657; ComponentLink3Description: LCSC Part URL; ComponentLink3URL: https://lcsc.com/product-detail/Multilayer-Ceramic-Capacitors-MLCC---SMD-SMT_PSAProsperity-Dielectrics-PSAProsperity-Dielectrics-FM21X392K251PXG_C565657.html
footprint CAP-0805 (0805 (2012M) Capacitor)
pins: 1, 2

## FM21X471K101PXG
designator C?  Capacitance: 470pF  (hidden comment: *)
Capacitor, Ceramic (MLCC), 470pF, ±10%, 100V, X7R, ±10%, SMD 0805; Manufacturer: PSA(Prosperity Dielectrics); Manufacturer Part Number: FM21X471K101PXG; Package Size: 0805; JLCPCB Basic Part: No; JLCPCB Part Number: C382239; Supplier 1: LCSC; Category: Capacitors - MLCC; Supplier Part Number 1: C382239; Tolerance: ±10%; Voltage Rating: 100V; Temperature Coefficient: X7R; RoHS: Yes; ComponentLink1Description: Datasheet; ComponentLink1URL: https://wmsc.lcsc.com/wmsc/upload/file/pdf/v2/lcsc/2304140030_PSA-Prosperity-Dielectrics-FM21X471K101PXG_C382239.pdf; ComponentLink2Description: JLCPCB Part URL; ComponentLink2URL: https://jlcpcb.com/partdetail/C382239; ComponentLink3Description: LCSC Part URL; ComponentLink3URL: https://lcsc.com/product-detail/Multilayer-Ceramic-Capacitors-MLCC---SMD-SMT_PSAProsperity-Dielectrics-PSAProsperity-Dielectrics-FM21X471K101PXG_C382239.html
footprint CAP-0805 (0805 (2012M) Capacitor)
pins: 1, 2

## FM21X471K251PXG
designator C?  Capacitance: 470pF  (hidden comment: *)
Capacitor, Ceramic (MLCC), 470pF, ±10%, 250V, X7R, ±10%, SMD 0805; Manufacturer: PSA(Prosperity Dielectrics); Manufacturer Part Number: FM21X471K251PXG; Package Size: 0805; JLCPCB Basic Part: No; JLCPCB Part Number: C2915709; Supplier 1: LCSC; Category: Capacitors - MLCC; Supplier Part Number 1: C2915709; Tolerance: ±10%; Voltage Rating: 250V; Temperature Coefficient: X7R; RoHS: Yes; ComponentLink1Description: Datasheet; ComponentLink1URL: https://wmsc.lcsc.com/wmsc/upload/file/pdf/v2/lcsc/2111161730_PSA-Prosperity-Dielectrics-FM21X471K251PXG_C2915709.pdf; ComponentLink2Description: JLCPCB Part URL; ComponentLink2URL: https://jlcpcb.com/partdetail/C2915709; ComponentLink3Description: LCSC Part URL; ComponentLink3URL: https://lcsc.com/product-detail/Multilayer-Ceramic-Capacitors-MLCC---SMD-SMT_PSAProsperity-Dielectrics-PSAProsperity-Dielectrics-FM21X471K251PXG_C2915709.html
footprint CAP-0805 (0805 (2012M) Capacitor)
pins: 1, 2

## FM21X471K501PXG
designator C?  Capacitance: 470pF  (hidden comment: *)
Capacitor, Ceramic (MLCC), 470pF, ±10%, 500V, X7R, ±10%, SMD 0805; Manufacturer: PSA(Prosperity Dielectrics); Manufacturer Part Number: FM21X471K501PXG; Package Size: 0805; JLCPCB Basic Part: No; JLCPCB Part Number: C464969; Supplier 1: LCSC; Category: Capacitors - MLCC; Supplier Part Number 1: C464969; Tolerance: ±10%; Voltage Rating: 500V; Temperature Coefficient: X7R; RoHS: Yes; ComponentLink1Description: Datasheet; ComponentLink1URL: https://wmsc.lcsc.com/wmsc/upload/file/pdf/v2/lcsc/2304140030_PSA-Prosperity-Dielectrics-FM21X471K501PXG_C464969.pdf; ComponentLink2Description: JLCPCB Part URL; ComponentLink2URL: https://jlcpcb.com/partdetail/C464969; ComponentLink3Description: LCSC Part URL; ComponentLink3URL: https://lcsc.com/product-detail/Multilayer-Ceramic-Capacitors-MLCC---SMD-SMT_PSAProsperity-Dielectrics-PSAProsperity-Dielectrics-FM21X471K501PXG_C464969.html
footprint CAP-0805 (0805 (2012M) Capacitor)
pins: 1, 2

## FM21X472K101PXG
designator C?  Capacitance: 4.7nF  (hidden comment: *)
Capacitor, Ceramic (MLCC), 4.7nF, ±10%, 100V, X7R, ±10%, SMD 0805; Manufacturer: PSA(Prosperity Dielectrics); Manufacturer Part Number: FM21X472K101PXG; Package Size: 0805; JLCPCB Basic Part: No; JLCPCB Part Number: C565636; Supplier 1: LCSC; Category: Capacitors - MLCC; Supplier Part Number 1: C565636; Tolerance: ±10%; Voltage Rating: 100V; Temperature Coefficient: X7R; RoHS: Yes; ComponentLink1Description: Datasheet; ComponentLink1URL: https://wmsc.lcsc.com/wmsc/upload/file/pdf/v2/lcsc/2304140030_PSA-Prosperity-Dielectrics-FM21X472K101PXG_C565636.pdf; ComponentLink2Description: JLCPCB Part URL; ComponentLink2URL: https://jlcpcb.com/partdetail/C565636; ComponentLink3Description: LCSC Part URL; ComponentLink3URL: https://lcsc.com/product-detail/Multilayer-Ceramic-Capacitors-MLCC---SMD-SMT_PSAProsperity-Dielectrics-PSAProsperity-Dielectrics-FM21X472K101PXG_C565636.html
footprint CAP-0805 (0805 (2012M) Capacitor)
pins: 1, 2

## FM21X472K251PXG
designator C?  Capacitance: 4.7nF  (hidden comment: *)
Capacitor, Ceramic (MLCC), 4.7nF, ±10%, 250V, X7R, ±10%, SMD 0805; Manufacturer: PSA(Prosperity Dielectrics); Manufacturer Part Number: FM21X472K251PXG; Package Size: 0805; JLCPCB Basic Part: No; JLCPCB Part Number: C565658; Supplier 1: LCSC; Category: Capacitors - MLCC; Supplier Part Number 1: C565658; Tolerance: ±10%; Voltage Rating: 250V; Temperature Coefficient: X7R; RoHS: Yes; ComponentLink1Description: Datasheet; ComponentLink1URL: https://wmsc.lcsc.com/wmsc/upload/file/pdf/v2/lcsc/2304140030_PSA-Prosperity-Dielectrics-FM21X472K251PXG_C565658.pdf; ComponentLink2Description: JLCPCB Part URL; ComponentLink2URL: https://jlcpcb.com/partdetail/C565658; ComponentLink3Description: LCSC Part URL; ComponentLink3URL: https://lcsc.com/product-detail/Multilayer-Ceramic-Capacitors-MLCC---SMD-SMT_PSAProsperity-Dielectrics-PSAProsperity-Dielectrics-FM21X472K251PXG_C565658.html
footprint CAP-0805 (0805 (2012M) Capacitor)
pins: 1, 2

## FM21X473K101ECG
designator C?  Capacitance: 47nF  (hidden comment: *)
Capacitor, Ceramic (MLCC), 47nF, ±10%, 100V, X7R, ±10%, SMD 0805; Manufacturer: PSA(Prosperity Dielectrics); Manufacturer Part Number: FM21X473K101ECG; Package Size: 0805; JLCPCB Basic Part: No; JLCPCB Part Number: C525183; Supplier 1: LCSC; Category: Capacitors - MLCC; Supplier Part Number 1: C525183; Tolerance: ±10%; Voltage Rating: 100V; Temperature Coefficient: X7R; RoHS: Yes; ComponentLink1Description: Datasheet; ComponentLink1URL: https://wmsc.lcsc.com/wmsc/upload/file/pdf/v2/lcsc/2304140030_PSA-Prosperity-Dielectrics-FM21X473K101ECG_C525183.pdf; ComponentLink2Description: JLCPCB Part URL; ComponentLink2URL: https://jlcpcb.com/partdetail/C525183; ComponentLink3Description: LCSC Part URL; ComponentLink3URL: https://lcsc.com/product-detail/Multilayer-Ceramic-Capacitors-MLCC---SMD-SMT_PSAProsperity-Dielectrics-PSAProsperity-Dielectrics-FM21X473K101ECG_C525183.html
footprint CAP-0805 (0805 (2012M) Capacitor)
pins: 1, 2

## FM21X473K251ECG
designator C?  Capacitance: 47nF  (hidden comment: *)
Capacitor, Ceramic (MLCC), 47nF, ±10%, 250V, X7R, ±10%, SMD 0805; Manufacturer: PSA(Prosperity Dielectrics); Manufacturer Part Number: FM21X473K251ECG; Package Size: 0805; JLCPCB Basic Part: No; JLCPCB Part Number: C784086; Supplier 1: LCSC; Category: Capacitors - MLCC; Supplier Part Number 1: C784086; Tolerance: ±10%; Voltage Rating: 250V; Temperature Coefficient: X7R; RoHS: Yes; ComponentLink1Description: Datasheet; ComponentLink1URL: https://wmsc.lcsc.com/wmsc/upload/file/pdf/v2/lcsc/2304140030_PSA-Prosperity-Dielectrics-FM21X473K251ECG_C784086.pdf; ComponentLink2Description: JLCPCB Part URL; ComponentLink2URL: https://jlcpcb.com/partdetail/C784086; ComponentLink3Description: LCSC Part URL; ComponentLink3URL: https://lcsc.com/product-detail/Multilayer-Ceramic-Capacitors-MLCC---SMD-SMT_PSAProsperity-Dielectrics-PSAProsperity-Dielectrics-FM21X473K251ECG_C784086.html
footprint CAP-0805 (0805 (2012M) Capacitor)
pins: 1, 2

## FM21X474K101EIG
designator C?  Capacitance: 470nF  (hidden comment: *)
Capacitor, Ceramic (MLCC), 470nF, ±10%, 100V, X7R, ±10%, SMD 0805; Manufacturer: PSA(Prosperity Dielectrics); Manufacturer Part Number: FM21X474K101EIG; Package Size: 0805; JLCPCB Basic Part: No; JLCPCB Part Number: C382238; Supplier 1: LCSC; Category: Capacitors - MLCC; Supplier Part Number 1: C382238; Tolerance: ±10%; Voltage Rating: 100V; Temperature Coefficient: X7R; RoHS: Yes; ComponentLink1Description: Datasheet; ComponentLink1URL: https://wmsc.lcsc.com/wmsc/upload/file/pdf/v2/lcsc/2304140030_PSA-Prosperity-Dielectrics-FM21X474K101EIG_C382238.pdf; ComponentLink2Description: JLCPCB Part URL; ComponentLink2URL: https://jlcpcb.com/partdetail/C382238; ComponentLink3Description: LCSC Part URL; ComponentLink3URL: https://lcsc.com/product-detail/Multilayer-Ceramic-Capacitors-MLCC---SMD-SMT_PSAProsperity-Dielectrics-PSAProsperity-Dielectrics-FM21X474K101EIG_C382238.html
footprint CAP-0805 (0805 (2012M) Capacitor)
pins: 1, 2

## FM21X562K101PXG
designator C?  Capacitance: 5.6nF  (hidden comment: *)
Capacitor, Ceramic (MLCC), 5.6nF, ±10%, 100V, X7R, ±10%, SMD 0805; Manufacturer: PSA(Prosperity Dielectrics); Manufacturer Part Number: FM21X562K101PXG; Package Size: 0805; JLCPCB Basic Part: No; JLCPCB Part Number: C565637; Supplier 1: LCSC; Category: Capacitors - MLCC; Supplier Part Number 1: C565637; Tolerance: ±10%; Voltage Rating: 100V; Temperature Coefficient: X7R; RoHS: Yes; ComponentLink1Description: Datasheet; ComponentLink1URL: https://wmsc.lcsc.com/wmsc/upload/file/pdf/v2/lcsc/2304140030_PSA-Prosperity-Dielectrics-FM21X562K101PXG_C565637.pdf; ComponentLink2Description: JLCPCB Part URL; ComponentLink2URL: https://jlcpcb.com/partdetail/C565637; ComponentLink3Description: LCSC Part URL; ComponentLink3URL: https://lcsc.com/product-detail/Multilayer-Ceramic-Capacitors-MLCC---SMD-SMT_PSAProsperity-Dielectrics-PSAProsperity-Dielectrics-FM21X562K101PXG_C565637.html
footprint CAP-0805 (0805 (2012M) Capacitor)
pins: 1, 2

## FM21X562K251PXG
designator C?  Capacitance: 5.6nF  (hidden comment: *)
Capacitor, Ceramic (MLCC), 5.6nF, ±10%, 250V, X7R, ±10%, SMD 0805; Manufacturer: PSA(Prosperity Dielectrics); Manufacturer Part Number: FM21X562K251PXG; Package Size: 0805; JLCPCB Basic Part: No; JLCPCB Part Number: C565659; Supplier 1: LCSC; Category: Capacitors - MLCC; Supplier Part Number 1: C565659; Tolerance: ±10%; Voltage Rating: 250V; Temperature Coefficient: X7R; RoHS: Yes; ComponentLink1Description: Datasheet; ComponentLink1URL: https://wmsc.lcsc.com/wmsc/upload/file/pdf/v2/lcsc/2304140030_PSA-Prosperity-Dielectrics-FM21X562K251PXG_C565659.pdf; ComponentLink2Description: JLCPCB Part URL; ComponentLink2URL: https://jlcpcb.com/partdetail/C565659; ComponentLink3Description: LCSC Part URL; ComponentLink3URL: https://lcsc.com/product-detail/Multilayer-Ceramic-Capacitors-MLCC---SMD-SMT_PSAProsperity-Dielectrics-PSAProsperity-Dielectrics-FM21X562K251PXG_C565659.html
footprint CAP-0805 (0805 (2012M) Capacitor)
pins: 1, 2

## FM21X682K101PXG
designator C?  Capacitance: 6.8nF  (hidden comment: *)
Capacitor, Ceramic (MLCC), 6.8nF, ±10%, 100V, X7R, ±10%, SMD 0805; Manufacturer: PSA(Prosperity Dielectrics); Manufacturer Part Number: FM21X682K101PXG; Package Size: 0805; JLCPCB Basic Part: No; JLCPCB Part Number: C565638; Supplier 1: LCSC; Category: Capacitors - MLCC; Supplier Part Number 1: C565638; Tolerance: ±10%; Voltage Rating: 100V; Temperature Coefficient: X7R; RoHS: Yes; ComponentLink1Description: Datasheet; ComponentLink1URL: https://wmsc.lcsc.com/wmsc/upload/file/pdf/v2/lcsc/2304140030_PSA-Prosperity-Dielectrics-FM21X682K101PXG_C565638.pdf; ComponentLink2Description: JLCPCB Part URL; ComponentLink2URL: https://jlcpcb.com/partdetail/C565638; ComponentLink3Description: LCSC Part URL; ComponentLink3URL: https://lcsc.com/product-detail/Multilayer-Ceramic-Capacitors-MLCC---SMD-SMT_PSAProsperity-Dielectrics-PSAProsperity-Dielectrics-FM21X682K101PXG_C565638.html
footprint CAP-0805 (0805 (2012M) Capacitor)
pins: 1, 2

## FM21X682K251PXG
designator C?  Capacitance: 6.8nF  (hidden comment: *)
Capacitor, Ceramic (MLCC), 6.8nF, ±10%, 250V, X7R, ±10%, SMD 0805; Manufacturer: PSA(Prosperity Dielectrics); Manufacturer Part Number: FM21X682K251PXG; Package Size: 0805; JLCPCB Basic Part: No; JLCPCB Part Number: C565660; Supplier 1: LCSC; Category: Capacitors - MLCC; Supplier Part Number 1: C565660; Tolerance: ±10%; Voltage Rating: 250V; Temperature Coefficient: X7R; RoHS: Yes; ComponentLink1Description: Datasheet; ComponentLink1URL: https://wmsc.lcsc.com/wmsc/upload/file/pdf/v2/lcsc/2304140030_PSA-Prosperity-Dielectrics-FM21X682K251PXG_C565660.pdf; ComponentLink2Description: JLCPCB Part URL; ComponentLink2URL: https://jlcpcb.com/partdetail/C565660; ComponentLink3Description: LCSC Part URL; ComponentLink3URL: https://lcsc.com/product-detail/Multilayer-Ceramic-Capacitors-MLCC---SMD-SMT_PSAProsperity-Dielectrics-PSAProsperity-Dielectrics-FM21X682K251PXG_C565660.html
footprint CAP-0805 (0805 (2012M) Capacitor)
pins: 1, 2
